# Altium schematic symbol library Wurth_Elektronik_Passive_rev16a.SCHLIB: 1143 symbols (part 14 of 27) (continued)
## WE-SI_744119
designator L?, comment <br> Leaded Toroidal Storage Choke / <br> / <br> / <br><b> Characteristics / <br> / <br></b></b> Low magnetic stray field / <br> / <br> Low leakage and minimal noise because of the toroidal core made of iron powder / <br> / <br> Available for rated currents 0.5 A, 1 A, 3 A and 5 A / <br> / <br> Custom designs on request / <br> / <br> / <br><b> Applications / <br> / <br></b> Perfectly suitable for switching regulators from / <br> – Texas Instruments (LM) / <br> – Linear Technology (LT) / <br>– Maxim / <br> / <br> Used for example in switching power supplies and voltage transformers / <br> / <br> Switching regulators up to 100 kHz / <br> / <br> / <br> / <br><a href="http://katalog.we-online.de/media/images/eisos/IndSI_pf2.jpg" title="Enlarge picture"> / <img src="http://katalog.we-online.de/media/images/eisos/IndSI_pf2.jpg" width="320"></a><p> / Details see: <a href="http://katalog.we-online.de/en/pbs/WE-SI/744101">http://katalog.we-online.de/en/pbs/WE-SI/744101</a><p> / </b>Updated  by  Dan Xu 2014-06-10<br> / </b>2014 (C) Wurth Elektronik
footprint WE-SI_744119
pins: 1, 2

## WE-SI_744131
designator L?, comment <br> Leaded Toroidal Storage Choke / <br> / <br> / <br><b> Characteristics / <br> / <br></b></b> Low magnetic stray field / <br> / <br> Low leakage and minimal noise because of the toroidal core made of iron powder / <br> / <br> Available for rated currents 0.5 A, 1 A, 3 A and 5 A / <br> / <br> Custom designs on request / <br> / <br> / <br><b> Applications / <br> / <br></b> Perfectly suitable for switching regulators from / <br> – Texas Instruments (LM) / <br> – Linear Technology (LT) / <br>– Maxim / <br> / <br> Used for example in switching power supplies and voltage transformers / <br> / <br> Switching regulators up to 100 kHz / <br> / <br> / <br> / <br><a href="http://katalog.we-online.de/media/images/eisos/IndSI_pf2.jpg" title="Enlarge picture"> / <img src="http://katalog.we-online.de/media/images/eisos/IndSI_pf2.jpg" width="320"></a><p> / Details see: <a href="http://katalog.we-online.de/en/pbs/WE-SI/744101">http://katalog.we-online.de/en/pbs/WE-SI/744101</a><p> / </b>Updated  by  Dan Xu 2014-06-10<br> / </b>2014 (C) Wurth Elektronik
footprint WE-SI_744131
pins: 1, 2

## WE-SI_744132
designator L?, comment <br> Leaded Toroidal Storage Choke / <br> / <br> / <br><b> Characteristics / <br> / <br></b></b> Low magnetic stray field / <br> / <br> Low leakage and minimal noise because of the toroidal core made of iron powder / <br> / <br> Available for rated currents 0.5 A, 1 A, 3 A and 5 A / <br> / <br> Custom designs on request / <br> / <br> / <br><b> Applications / <br> / <br></b> Perfectly suitable for switching regulators from / <br> – Texas Instruments (LM) / <br> – Linear Technology (LT) / <br>– Maxim / <br> / <br> Used for example in switching power supplies and voltage transformers / <br> / <br> Switching regulators up to 100 kHz / <br> / <br> / <br> / <br><a href="http://katalog.we-online.de/media/images/eisos/IndSI_pf2.jpg" title="Enlarge picture"> / <img src="http://katalog.we-online.de/media/images/eisos/IndSI_pf2.jpg" width="320"></a><p> / Details see: <a href="http://katalog.we-online.de/en/pbs/WE-SI/744101">http://katalog.we-online.de/en/pbs/WE-SI/744101</a><p> / </b>Updated  by  Dan Xu 2014-06-10<br> / </b>2014 (C) Wurth Elektronik
footprint WE-SI_744132
pins: 1, 2

## WE-SI_744133
designator L?, comment <br> Leaded Toroidal Storage Choke / <br> / <br> / <br><b> Characteristics / <br> / <br></b></b> Low magnetic stray field / <br> / <br> Low leakage and minimal noise because of the toroidal core made of iron powder / <br> / <br> Available for rated currents 0.5 A, 1 A, 3 A and 5 A / <br> / <br> Custom designs on request / <br> / <br> / <br><b> Applications / <br> / <br></b> Perfectly suitable for switching regulators from / <br> – Texas Instruments (LM) / <br> – Linear Technology (LT) / <br>– Maxim / <br> / <br> Used for example in switching power supplies and voltage transformers / <br> / <br> Switching regulators up to 100 kHz / <br> / <br> / <br> / <br><a href="http://katalog.we-online.de/media/images/eisos/IndSI_pf2.jpg" title="Enlarge picture"> / <img src="http://katalog.we-online.de/media/images/eisos/IndSI_pf2.jpg" width="320"></a><p> / Details see: <a href="http://katalog.we-online.de/en/pbs/WE-SI/744101">http://katalog.we-online.de/en/pbs/WE-SI/744101</a><p> / </b>Updated  by  Dan Xu 2014-06-10<br> / </b>2014 (C) Wurth Elektronik
footprint WE-SI_744133
pins: 1, 2

## WE-SI_744134
designator L?, comment <br> Leaded Toroidal Storage Choke / <br> / <br> / <br><b> Characteristics / <br> / <br></b></b> Low magnetic stray field / <br> / <br> Low leakage and minimal noise because of the toroidal core made of iron powder / <br> / <br> Available for rated currents 0.5 A, 1 A, 3 A and 5 A / <br> / <br> Custom designs on request / <br> / <br> / <br><b> Applications / <br> / <br></b> Perfectly suitable for switching regulators from / <br> – Texas Instruments (LM) / <br> – Linear Technology (LT) / <br>– Maxim / <br> / <br> Used for example in switching power supplies and voltage transformers / <br> / <br> Switching regulators up to 100 kHz / <br> / <br> / <br> / <br><a href="http://katalog.we-online.de/media/images/eisos/IndSI_pf2.jpg" title="Enlarge picture"> / <img src="http://katalog.we-online.de/media/images/eisos/IndSI_pf2.jpg" width="320"></a><p> / Details see: <a href="http://katalog.we-online.de/en/pbs/WE-SI/744101">http://katalog.we-online.de/en/pbs/WE-SI/744101</a><p> / </b>Updated  by  Dan Xu 2014-06-10<br> / </b>2014 (C) Wurth Elektronik
footprint WE-SI_744134
pins: 1, 2

## WE-SI_744135
designator L?, comment <br> Leaded Toroidal Storage Choke / <br> / <br> / <br><b> Characteristics / <br> / <br></b></b> Low magnetic stray field / <br> / <br> Low leakage and minimal noise because of the toroidal core made of iron powder / <br> / <br> Available for rated currents 0.5 A, 1 A, 3 A and 5 A / <br> / <br> Custom designs on request / <br> / <br> / <br><b> Applications / <br> / <br></b> Perfectly suitable for switching regulators from / <br> – Texas Instruments (LM) / <br> – Linear Technology (LT) / <br>– Maxim / <br> / <br> Used for example in switching power supplies and voltage transformers / <br> / <br> Switching regulators up to 100 kHz / <br> / <br> / <br> / <br><a href="http://katalog.we-online.de/media/images/eisos/IndSI_pf2.jpg" title="Enlarge picture"> / <img src="http://katalog.we-online.de/media/images/eisos/IndSI_pf2.jpg" width="320"></a><p> / Details see: <a href="http://katalog.we-online.de/en/pbs/WE-SI/744101">http://katalog.we-online.de/en/pbs/WE-SI/744101</a><p> / </b>Updated  by  Dan Xu 2014-06-10<br> / </b>2014 (C) Wurth Elektronik
footprint WE-SI_744135
pins: 1, 2

## WE-SI_744136
designator L?, comment <br> Leaded Toroidal Storage Choke / <br> / <br> / <br><b> Characteristics / <br> / <br></b></b> Low magnetic stray field / <br> / <br> Low leakage and minimal noise because of the toroidal core made of iron powder / <br> / <br> Available for rated currents 0.5 A, 1 A, 3 A and 5 A / <br> / <br> Custom designs on request / <br> / <br> / <br><b> Applications / <br> / <br></b> Perfectly suitable for switching regulators from / <br> – Texas Instruments (LM) / <br> – Linear Technology (LT) / <br>– Maxim / <br> / <br> Used for example in switching power supplies and voltage transformers / <br> / <br> Switching regulators up to 100 kHz / <br> / <br> / <br> / <br><a href="http://katalog.we-online.de/media/images/eisos/IndSI_pf2.jpg" title="Enlarge picture"> / <img src="http://katalog.we-online.de/media/images/eisos/IndSI_pf2.jpg" width="320"></a><p> / Details see: <a href="http://katalog.we-online.de/en/pbs/WE-SI/744101">http://katalog.we-online.de/en/pbs/WE-SI/744101</a><p> / </b>Updated  by  Dan Xu 2014-06-10<br> / </b>2014 (C) Wurth Elektronik
footprint WE-SI_744136
pins: 1, 2

## WE-SI_744137
designator L?, comment <br> Leaded Toroidal Storage Choke / <br> / <br> / <br><b> Characteristics / <br> / <br></b></b> Low magnetic stray field / <br> / <br> Low leakage and minimal noise because of the toroidal core made of iron powder / <br> / <br> Available for rated currents 0.5 A, 1 A, 3 A and 5 A / <br> / <br> Custom designs on request / <br> / <br> / <br><b> Applications / <br> / <br></b> Perfectly suitable for switching regulators from / <br> – Texas Instruments (LM) / <br> – Linear Technology (LT) / <br>– Maxim / <br> / <br> Used for example in switching power supplies and voltage transformers / <br> / <br> Switching regulators up to 100 kHz / <br> / <br> / <br> / <br><a href="http://katalog.we-online.de/media/images/eisos/IndSI_pf2.jpg" title="Enlarge picture"> / <img src="http://katalog.we-online.de/media/images/eisos/IndSI_pf2.jpg" width="320"></a><p> / Details see: <a href="http://katalog.we-online.de/en/pbs/WE-SI/744101">http://katalog.we-online.de/en/pbs/WE-SI/744101</a><p> / </b>Updated  by  Dan Xu 2014-06-10<br> / </b>2014 (C) Wurth Elektronik
footprint WE-SI_744137
pins: 1, 2

## WE-SI_744138
designator L?, comment <br> Leaded Toroidal Storage Choke / <br> / <br> / <br><b> Characteristics / <br> / <br></b></b> Low magnetic stray field / <br> / <br> Low leakage and minimal noise because of the toroidal core made of iron powder / <br> / <br> Available for rated currents 0.5 A, 1 A, 3 A and 5 A / <br> / <br> Custom designs on request / <br> / <br> / <br><b> Applications / <br> / <br></b> Perfectly suitable for switching regulators from / <br> – Texas Instruments (LM) / <br> – Linear Technology (LT) / <br>– Maxim / <br> / <br> Used for example in switching power supplies and voltage transformers / <br> / <br> Switching regulators up to 100 kHz / <br> / <br> / <br> / <br><a href="http://katalog.we-online.de/media/images/eisos/IndSI_pf2.jpg" title="Enlarge picture"> / <img src="http://katalog.we-online.de/media/images/eisos/IndSI_pf2.jpg" width="320"></a><p> / Details see: <a href="http://katalog.we-online.de/en/pbs/WE-SI/744101">http://katalog.we-online.de/en/pbs/WE-SI/744101</a><p> / </b>Updated  by  Dan Xu 2014-06-10<br> / </b>2014 (C) Wurth Elektronik
footprint WE-SI_744138
pins: 1, 2

## WE-SI_744139
designator L?, comment <br> Leaded Toroidal Storage Choke / <br> / <br> / <br><b> Characteristics / <br> / <br></b></b> Low magnetic stray field / <br> / <br> Low leakage and minimal noise because of the toroidal core made of iron powder / <br> / <br> Available for rated currents 0.5 A, 1 A, 3 A and 5 A / <br> / <br> Custom designs on request / <br> / <br> / <br><b> Applications / <br> / <br></b> Perfectly suitable for switching regulators from / <br> – Texas Instruments (LM) / <br> – Linear Technology (LT) / <br>– Maxim / <br> / <br> Used for example in switching power supplies and voltage transformers / <br> / <br> Switching regulators up to 100 kHz / <br> / <br> / <br> / <br><a href="http://katalog.we-online.de/media/images/eisos/IndSI_pf2.jpg" title="Enlarge picture"> / <img src="http://katalog.we-online.de/media/images/eisos/IndSI_pf2.jpg" width="320"></a><p> / Details see: <a href="http://katalog.we-online.de/en/pbs/WE-SI/744101">http://katalog.we-online.de/en/pbs/WE-SI/744101</a><p> / </b>Updated  by  Dan Xu 2014-06-10<br> / </b>2014 (C) Wurth Elektronik
footprint WE-SI_744139
pins: 1, 2

## WE-SI_744150
designator L?, comment <br> Leaded Toroidal Storage Choke / <br> / <br> / <br><b> Characteristics / <br> / <br></b></b> Low magnetic stray field / <br> / <br> Low leakage and minimal noise because of the toroidal core made of iron powder / <br> / <br> Available for rated currents 0.5 A, 1 A, 3 A and 5 A / <br> / <br> Custom designs on request / <br> / <br> / <br><b> Applications / <br> / <br></b> Perfectly suitable for switching regulators from / <br> – Texas Instruments (LM) / <br> – Linear Technology (LT) / <br>– Maxim / <br> / <br> Used for example in switching power supplies and voltage transformers / <br> / <br> Switching regulators up to 100 kHz / <br> / <br> / <br> / <br><a href="http://katalog.we-online.de/media/images/eisos/IndSI_pf2.jpg" title="Enlarge picture"> / <img src="http://katalog.we-online.de/media/images/eisos/IndSI_pf2.jpg" width="320"></a><p> / Details see: <a href="http://katalog.we-online.de/en/pbs/WE-SI/744101">http://katalog.we-online.de/en/pbs/WE-SI/744101</a><p> / </b>Updated  by  Dan Xu 2014-06-10<br> / </b>2014 (C) Wurth Elektronik
footprint WE-SI_744150
pins: 1, 2

## WE-SI_744151
designator L?, comment <br> Leaded Toroidal Storage Choke / <br> / <br> / <br><b> Characteristics / <br> / <br></b></b> Low magnetic stray field / <br> / <br> Low leakage and minimal noise because of the toroidal core made of iron powder / <br> / <br> Available for rated currents 0.5 A, 1 A, 3 A and 5 A / <br> / <br> Custom designs on request / <br> / <br> / <br><b> Applications / <br> / <br></b> Perfectly suitable for switching regulators from / <br> – Texas Instruments (LM) / <br> – Linear Technology (LT) / <br>– Maxim / <br> / <br> Used for example in switching power supplies and voltage transformers / <br> / <br> Switching regulators up to 100 kHz / <br> / <br> / <br> / <br><a href="http://katalog.we-online.de/media/images/eisos/IndSI_pf2.jpg" title="Enlarge picture"> / <img src="http://katalog.we-online.de/media/images/eisos/IndSI_pf2.jpg" width="320"></a><p> / Details see: <a href="http://katalog.we-online.de/en/pbs/WE-SI/744101">http://katalog.we-online.de/en/pbs/WE-SI/744101</a><p> / </b>Updated  by  Dan Xu 2014-06-10<br> / </b>2014 (C) Wurth Elektronik
footprint WE-SI_744151
pins: 1, 2

## WE-SI_744152
designator L?, comment <br> Leaded Toroidal Storage Choke / <br> / <br> / <br><b> Characteristics / <br> / <br></b></b> Low magnetic stray field / <br> / <br> Low leakage and minimal noise because of the toroidal core made of iron powder / <br> / <br> Available for rated currents 0.5 A, 1 A, 3 A and 5 A / <br> / <br> Custom designs on request / <br> / <br> / <br><b> Applications / <br> / <br></b> Perfectly suitable for switching regulators from / <br> – Texas Instruments (LM) / <br> – Linear Technology (LT) / <br>– Maxim / <br> / <br> Used for example in switching power supplies and voltage transformers / <br> / <br> Switching regulators up to 100 kHz / <br> / <br> / <br> / <br><a href="http://katalog.we-online.de/media/images/eisos/IndSI_pf2.jpg" title="Enlarge picture"> / <img src="http://katalog.we-online.de/media/images/eisos/IndSI_pf2.jpg" width="320"></a><p> / Details see: <a href="http://katalog.we-online.de/en/pbs/WE-SI/744101">http://katalog.we-online.de/en/pbs/WE-SI/744101</a><p> / </b>Updated  by  Dan Xu 2014-06-10<br> / </b>2014 (C) Wurth Elektronik
footprint WE-SI_744152
pins: 1, 2

## WE-SI_744153
designator L?, comment <br> Leaded Toroidal Storage Choke / <br> / <br> / <br><b> Characteristics / <br> / <br></b></b> Low magnetic stray field / <br> / <br> Low leakage and minimal noise because of the toroidal core made of iron powder / <br> / <br> Available for rated currents 0.5 A, 1 A, 3 A and 5 A / <br> / <br> Custom designs on request / <br> / <br> / <br><b> Applications / <br> / <br></b> Perfectly suitable for switching regulators from / <br> – Texas Instruments (LM) / <br> – Linear Technology (LT) / <br>– Maxim / <br> / <br> Used for example in switching power supplies and voltage transformers / <br> / <br> Switching regulators up to 100 kHz / <br> / <br> / <br> / <br><a href="http://katalog.we-online.de/media/images/eisos/IndSI_pf2.jpg" title="Enlarge picture"> / <img src="http://katalog.we-online.de/media/images/eisos/IndSI_pf2.jpg" width="320"></a><p> / Details see: <a href="http://katalog.we-online.de/en/pbs/WE-SI/744101">http://katalog.we-online.de/en/pbs/WE-SI/744101</a><p> / </b>Updated  by  Dan Xu 2014-06-10<br> / </b>2014 (C) Wurth Elektronik
footprint WE-SI_744153
pins: 1, 2

## WE-SI_744154
designator L?, comment <br> Leaded Toroidal Storage Choke / <br> / <br> / <br><b> Characteristics / <br> / <br></b></b> Low magnetic stray field / <br> / <br> Low leakage and minimal noise because of the toroidal core made of iron powder / <br> / <br> Available for rated currents 0.5 A, 1 A, 3 A and 5 A / <br> / <br> Custom designs on request / <br> / <br> / <br><b> Applications / <br> / <br></b> Perfectly suitable for switching regulators from / <br> – Texas Instruments (LM) / <br> – Linear Technology (LT) / <br>– Maxim / <br> / <br> Used for example in switching power supplies and voltage transformers / <br> / <br> Switching regulators up to 100 kHz / <br> / <br> / <br> / <br><a href="http://katalog.we-online.de/media/images/eisos/IndSI_pf2.jpg" title="Enlarge picture"> / <img src="http://katalog.we-online.de/media/images/eisos/IndSI_pf2.jpg" width="320"></a><p> / Details see: <a href="http://katalog.we-online.de/en/pbs/WE-SI/744101">http://katalog.we-online.de/en/pbs/WE-SI/744101</a><p> / </b>Updated  by  Dan Xu 2014-06-10<br> / </b>2014 (C) Wurth Elektronik
footprint WE-SI_744154
pins: 1, 2

## WE-SI_744155
designator L?, comment <br> Leaded Toroidal Storage Choke / <br> / <br> / <br><b> Characteristics / <br> / <br></b></b> Low magnetic stray field / <br> / <br> Low leakage and minimal noise because of the toroidal core made of iron powder / <br> / <br> Available for rated currents 0.5 A, 1 A, 3 A and 5 A / <br> / <br> Custom designs on request / <br> / <br> / <br><b> Applications / <br> / <br></b> Perfectly suitable for switching regulators from / <br> – Texas Instruments (LM) / <br> – Linear Technology (LT) / <br>– Maxim / <br> / <br> Used for example in switching power supplies and voltage transformers / <br> / <br> Switching regulators up to 100 kHz / <br> / <br> / <br> / <br><a href="http://katalog.we-online.de/media/images/eisos/IndSI_pf2.jpg" title="Enlarge picture"> / <img src="http://katalog.we-online.de/media/images/eisos/IndSI_pf2.jpg" width="320"></a><p> / Details see: <a href="http://katalog.we-online.de/en/pbs/WE-SI/744101">http://katalog.we-online.de/en/pbs/WE-SI/744101</a><p> / </b>Updated  by  Dan Xu 2014-06-10<br> / </b>2014 (C) Wurth Elektronik
footprint WE-SI_744155
pins: 1, 2

## WE-SI_744156
designator L?, comment <br> Leaded Toroidal Storage Choke / <br> / <br> / <br><b> Characteristics / <br> / <br></b></b> Low magnetic stray field / <br> / <br> Low leakage and minimal noise because of the toroidal core made of iron powder / <br> / <br> Available for rated currents 0.5 A, 1 A, 3 A and 5 A / <br> / <br> Custom designs on request / <br> / <br> / <br><b> Applications / <br> / <br></b> Perfectly suitable for switching regulators from / <br> – Texas Instruments (LM) / <br> – Linear Technology (LT) / <br>– Maxim / <br> / <br> Used for example in switching power supplies and voltage transformers / <br> / <br> Switching regulators up to 100 kHz / <br> / <br> / <br> / <br><a href="http://katalog.we-online.de/media/images/eisos/IndSI_pf2.jpg" title="Enlarge picture"> / <img src="http://katalog.we-online.de/media/images/eisos/IndSI_pf2.jpg" width="320"></a><p> / Details see: <a href="http://katalog.we-online.de/en/pbs/WE-SI/744101">http://katalog.we-online.de/en/pbs/WE-SI/744101</a><p> / </b>Updated  by  Dan Xu 2014-06-10<br> / </b>2014 (C) Wurth Elektronik
footprint WE-SI_744156
pins: 1, 2

## WE-SI_7441110
designator L?, comment <br> Leaded Toroidal Storage Choke / <br> / <br> / <br><b> Characteristics / <br> / <br></b></b> Low magnetic stray field / <br> / <br> Low leakage and minimal noise because of the toroidal core made of iron powder / <br> / <br> Available for rated currents 0.5 A, 1 A, 3 A and 5 A / <br> / <br> Custom designs on request / <br> / <br> / <br><b> Applications / <br> / <br></b> Perfectly suitable for switching regulators from / <br> – Texas Instruments (LM) / <br> – Linear Technology (LT) / <br>– Maxim / <br> / <br> Used for example in switching power supplies and voltage transformers / <br> / <br> Switching regulators up to 100 kHz / <br> / <br> / <br> / <br><a href="http://katalog.we-online.de/media/images/eisos/IndSI_pf2.jpg" title="Enlarge picture"> / <img src="http://katalog.we-online.de/media/images/eisos/IndSI_pf2.jpg" width="320"></a><p> / Details see: <a href="http://katalog.we-online.de/en/pbs/WE-SI/744101">http://katalog.we-online.de/en/pbs/WE-SI/744101</a><p> / </b>Updated  by  Dan Xu 2014-06-10<br> / </b>2014 (C) Wurth Elektronik
footprint WE-SI_7441110
pins: 1, 2

## WE-SI_7441501
designator L?, comment <br> Leaded Toroidal Storage Choke / <br> / <br> / <br><b> Characteristics / <br> / <br></b></b> Low magnetic stray field / <br> / <br> Low leakage and minimal noise because of the toroidal core made of iron powder / <br> / <br> Available for rated currents 0.5 A, 1 A, 3 A and 5 A / <br> / <br> Custom designs on request / <br> / <br> / <br><b> Applications / <br> / <br></b> Perfectly suitable for switching regulators from / <br> – Texas Instruments (LM) / <br> – Linear Technology (LT) / <br>– Maxim / <br> / <br> Used for example in switching power supplies and voltage transformers / <br> / <br> Switching regulators up to 100 kHz / <br> / <br> / <br> / <br><a href="http://katalog.we-online.de/media/images/eisos/IndSI_pf2.jpg" title="Enlarge picture"> / <img src="http://katalog.we-online.de/media/images/eisos/IndSI_pf2.jpg" width="320"></a><p> / Details see: <a href="http://katalog.we-online.de/en/pbs/WE-SI/744101">http://katalog.we-online.de/en/pbs/WE-SI/744101</a><p> / </b>Updated  by  Dan Xu 2014-06-10<br> / </b>2014 (C) Wurth Elektronik
footprint WE-SI_7441501
pins: 1, 2

## WE-SL1_SL1
designator L?, comment <b>SMD Common Mode Line Filter WE-SL1</b><p> / - Small size<br> / - Low Profile, only 1,65 mm<br> / - High Impedance up to 2000 ohm<br> / - High Current up to 300mA <br> / - Low leakage inductance<br><br> / -- USB<br> / -- CAN<br> / -- Firewire<br> / -- Data Lines<br> / -- Power Lines<br> / <br><a href="http://katalog.we-online.de/media/images/eisos/IndSL1_pf2.jpg" title="Enlarge picture"> / <img src="http://katalog.we-online.de/media/images/eisos/IndSL1_pf2.jpg" width="320"></a><p> / Details see: <a href="http://katalog.we-online.de/en/pbs/WE-SL1?">http://katalog.we-online.de/en/pbs/WE-SL1?1</a><p> / </b>Updated  by  Dan Xu 2014-07-11<br> / </b>2014 (C) Würth Elektronik
footprint WE-SL1
pins: 1 4, 3 1, 4 2, 5 3

## WE-SL2_SL2
designator L?, comment <b>SMD Common-Mode Line Filter WE-SL2</b><p> / For distortion-free removal of noise from transmitted / electrical signals<br> / - Double current-compensated choke<br> / - Offering a wide band width with the core materials NiZn/MnZn<br><br> / -- Current compensated choke for data and signal lines<br> / -- Power supply systems<br> / -- Filter for measurement signals<br> / -- CAN / <br><a href="http://katalog.we-online.de/media/images/eisos/IndSL2_pf2.jpg" title="Enlarge picture"> / <img src="http://katalog.we-online.de/media/images/eisos/IndSL2_pf2.jpg" width="320"></a><p> / Details see: <a href="http://katalog.we-online.de/en/pbs/WE-SL2?">http://katalog.we-online.de/en/pbs/WE-SL2?</a><p> / </b>Updated  by  Dan Xu 2014-07-11<br> / </b>2014 (C) Würth Elektronik
footprint WE-SL2
pins: 1, 2 4, 3, 4 2

## WE-SL3_744252..._744252
designator L?, comment <b>SMD Common Mode Line Filter WE-SL3</b><p> / - Small size<br> - Low Profile, only 2.5 mm<br>- High Impedance tp to 5000 ohm<br>- High Current up to 700mA <br> / - Low leakage inductance<p> / - USB<br> / - CAN<br> / -  Firewire<br> / - Data Lines<br> / - Power Lines<br> / <br><a href="http://katalog.we-online.de/media/images/eisos/IndSL3_pf2.jpg" title="Enlarge picture"> / <img src="http://katalog.we-online.de/media/images/eisos/IndSL3_pf2.jpg" width="320"></a><p> / Details see: <a href="http://katalog.we-online.de/en/pbs/WE-SL3?">http://katalog.we-online.de/en/pbs/WE-SL3?</a><p> / </b>Updated  by  Dan Xu 2014-07-11<br> / </b>2014 (C) Würth Elektronik
footprint WE-SL3_744252...
pins: 1 4, 3 1, 4 2, 6 3

## WE-SL3_744253..._744252XXX
designator L?, comment <b>SMD Common Mode Line Filter WE-SL3</b><p> / - Small size<br> - Low Profile, only 2.5 mm<br>- High Impedance tp to 5000 ohm<br>- High Current up to 700mA <br> / - Low leakage inductance<p> / - USB<br> / - CAN<br> / -  Firewire<br> / - Data Lines<br> / - Power Lines<br> / <br><a href="http://katalog.we-online.de/media/images/eisos/IndSL3_pf2.jpg" title="Enlarge picture"> / <img src="http://katalog.we-online.de/media/images/eisos/IndSL3_pf2.jpg" width="320"></a><p> / Details see: <a href="http://katalog.we-online.de/en/pbs/WE-SL3?">http://katalog.we-online.de/en/pbs/WE-SL3?</a><p> / </b>Updated  by  Dan Xu 2014-07-11<br> / </b>2014 (C) Würth Elektronik
footprint WE-SL3_744253...
pins: 1, 2, 3, 4, 5, 6

## WE-SL3_HV
designator L?, comment <b>SMD Common Mode Line Filter WE-SL3 HV with 1.5 kV Isolation Voltage</b><p> / - 1.5 kV isolation voltage <br> / - Low profile<br> / - Small sinze<br> / - Excellent attenuation characteristics<br><br> / -- 10/100/1000 Base-T<br> / -- xDSL<br> / -- Modem<br> / -- T1/E1<br> / -- ISDN<br> / -- For TNV-circuits
footprint WE-SL3_HV
pins: 1, 3 4, 4 3, 6 2

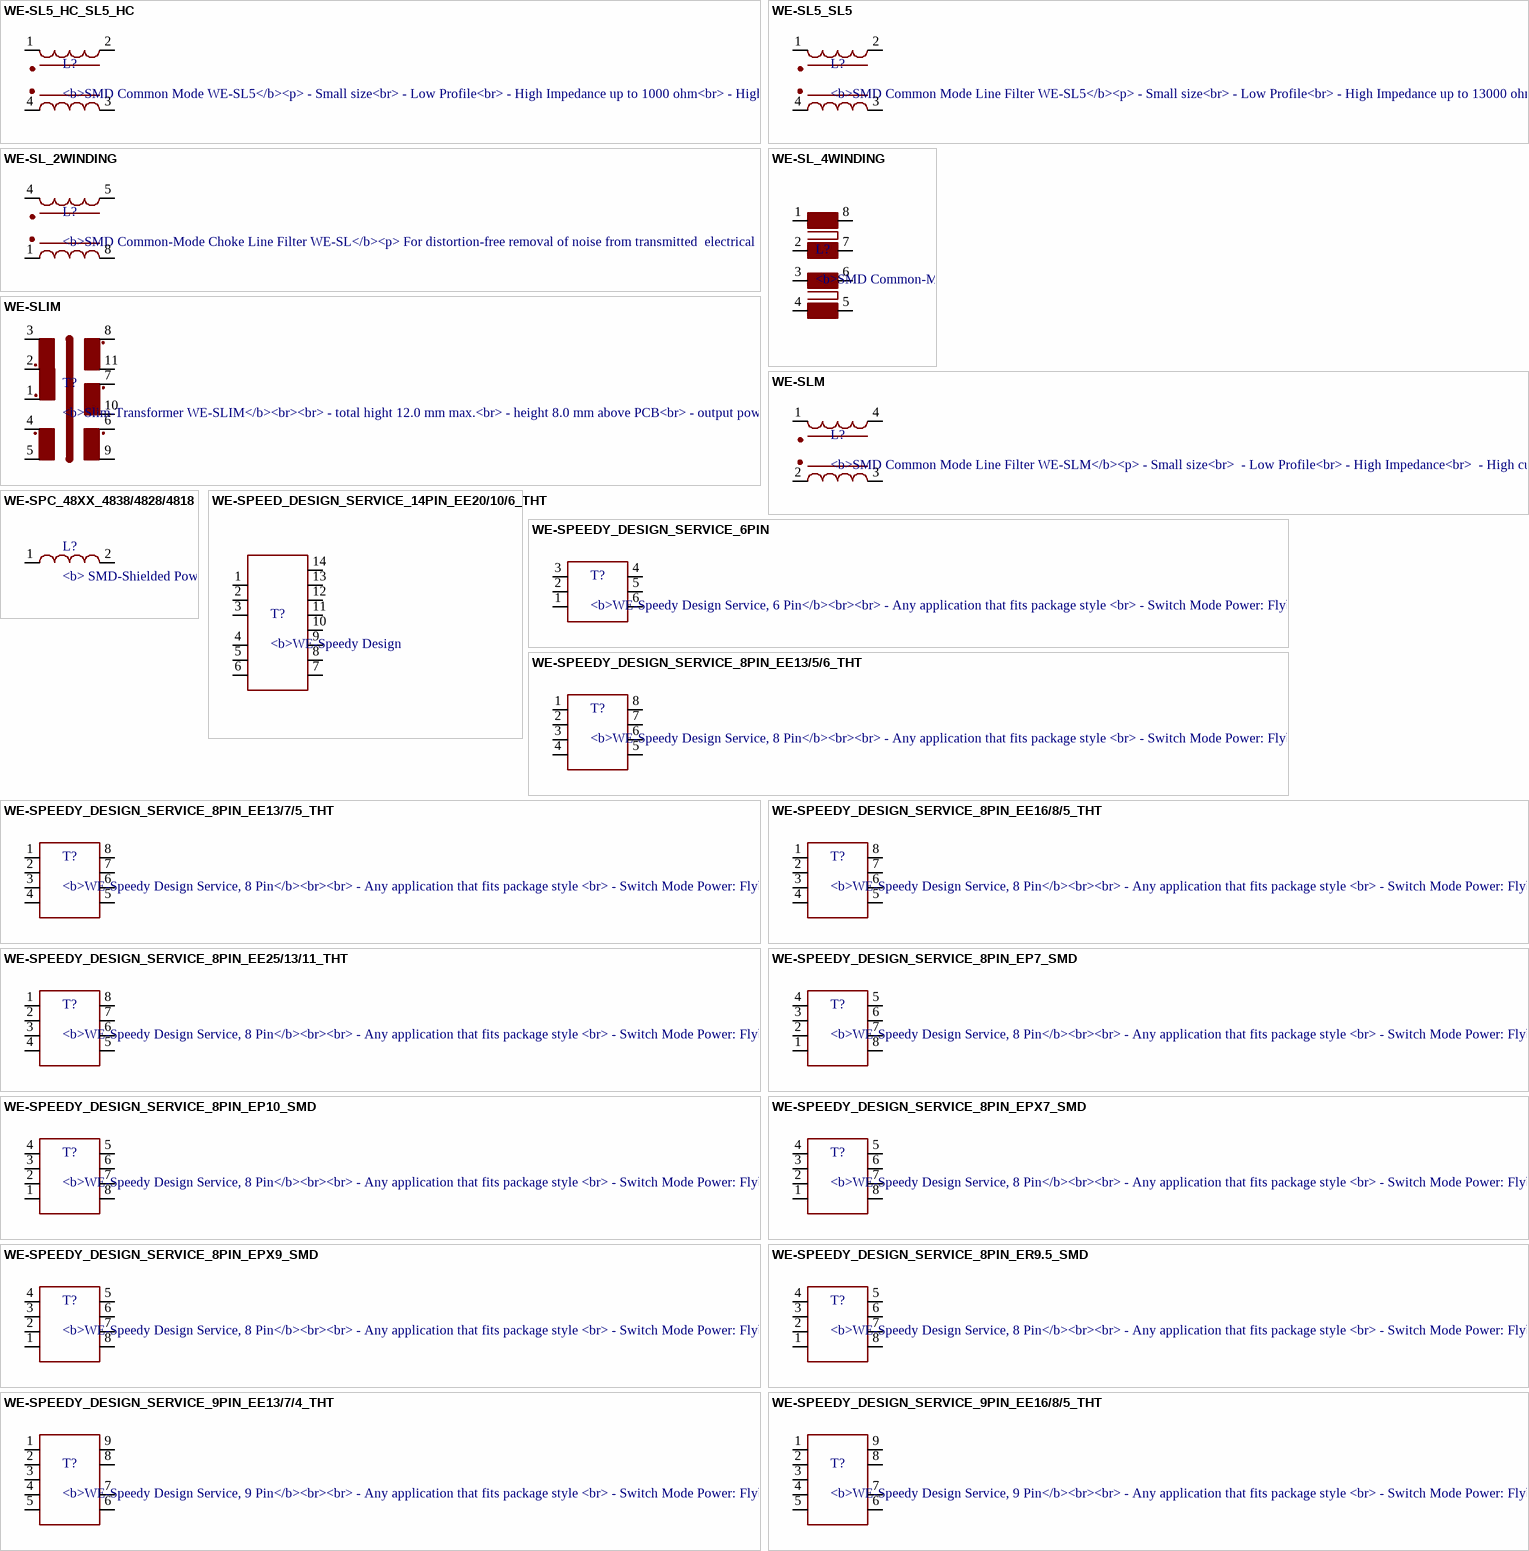
[diagram p44: symbols WE-SL5_HC_SL5_HC to WE-SPEEDY_DESIGN_SERVICE_9PIN_EE16/8/5_THT]

## WE-SL5_HC_SL5_HC
designator L?, comment <b>SMD Common Mode WE-SL5</b><p> / - Small size<br> / - Low Profile<br> / - High Impedance up to 1000 ohm<br> / - High Current up to 5000mA <P> / -- Data Lines<br> / -- Power Lines / <br><a href="http://katalog.we-online.de/media/images/eisos/IndSL5HC_pf2.jpg" title="Enlarge picture"> / <img src="http://katalog.we-online.de/media/images/eisos/IndSL5_pf2.jpg" width="320"></a><p> / Details see: <a href="http://katalog.we-online.de/en/pbs/WE-SL5_HC?">http://katalog.we-online.de/en/pbs/WE-SL5_HC?</a><p> / </b>Updated  by  Dan Xu 2014-07-11<br> / </b>2014 (C) Würth Elektronik
footprint WE-SL5_HC
pins: 1, 2, 3, 4

## WE-SL5_SL5
designator L?, comment <b>SMD Common Mode Line Filter WE-SL5</b><p> / - Small size<br> / - Low Profile<br> / - High Impedance up to 13000 ohm<br> / - High Current up to 2500mA <P> / -- Data Lines<br> / -- Power Lines / <br><a href="http://katalog.we-online.de/media/images/eisos/IndSL5_pf2.jpg" title="Enlarge picture"> / <img src="http://katalog.we-online.de/media/images/eisos/IndSL5_pf2.jpg" width="320"></a><p> / Details see: <a href="http://katalog.we-online.de/en/pbs/WE-SL5?">http://katalog.we-online.de/en/pbs/WE-SL5?</a><p> / </b>Updated  by  Dan Xu 2014-07-11<br> / </b>2014 (C) Würth Elektronik
footprint WE-SL5
pins: 1, 2, 3, 4

## WE-SL_2WINDING
designator L?, comment <b>SMD Common-Mode Choke Line Filter WE-SL</b><p> / For distortion-free removal of noise from transmitted / electrical signals<br> / - 2 or 4 winding configuration<br> / - Offering a wide band width with the core materials of NiZn and MnZn<br><br> / -- Current compensated choke for data and signal lines<br> / -- USB/CAN/ISDN-Bus<br> / -- Power supply systems<br> / -- Control lines<br> / -- LAN, PBX, cable TV, CD-ROM, 8mm video, etc. / <br><a href="http://katalog.we-online.de/media/images/eisos/IndSL_pf2.jpg" title="Enlarge picture"> / <img src="http://katalog.we-online.de/media/images/eisos/IndSL_pf2.jpg" width="320"></a><p> / Details see: <a href="http://katalog.we-online.de/en/pbs/WE-SL?">http://katalog.we-online.de/en/pbs/WE-SL?</a><p> / </b>Updated  by  Dan Xu 2014-07-11<br> / </b>2014 (C) Würth Elektronik
footprint WE-SL_2WINDING
pins: 1 4, 4 1, 5 2, 8 3